# Altium schematic symbol library Wurth_Elektronik_Passive_rev16a.SCHLIB: 1143 symbols (part 11 of 27)
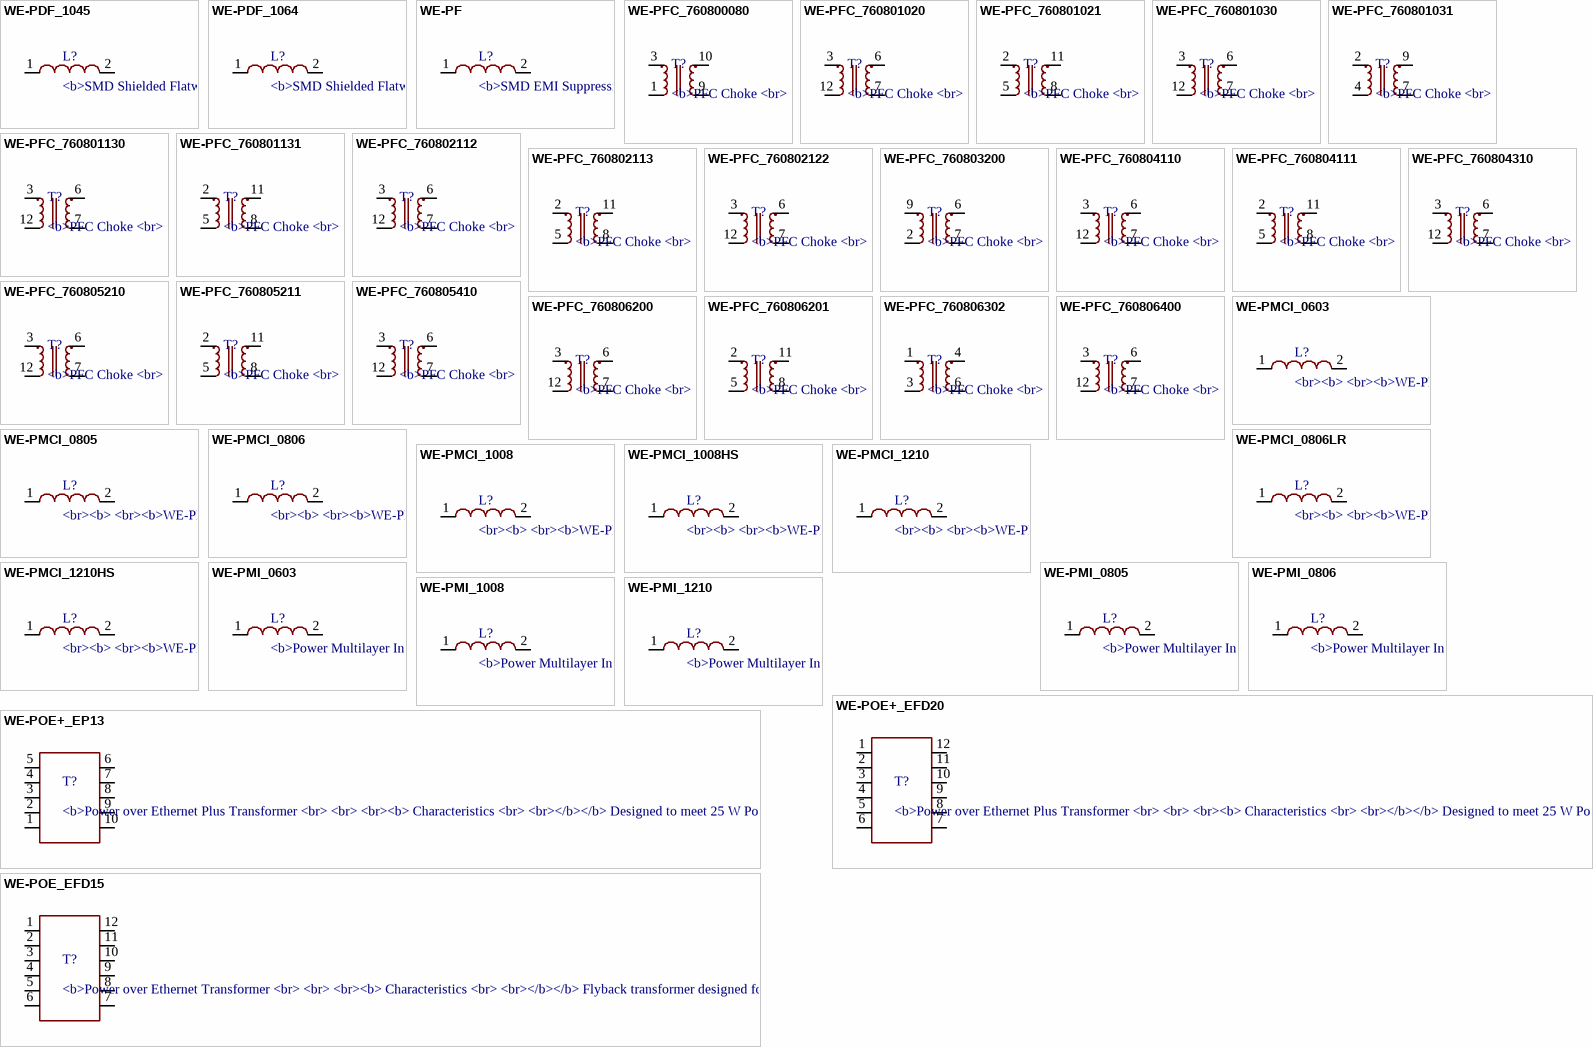
[diagram p68: symbols WE-PDF_1045 to WE-POE_EFD15]

## WE-PFC_760801031
designator T?, comment <b>PFC Choke / <br> / <br> / <br><b> Characteristics / <br> / <br></b></b> PFC choke for power up to 250 W / <br> / <br> Operating temperature: –40 °C to +125 °C / <br> / <br> PQ 38/11 construction height <10 mm above PCB / <br> / <br> Auxiliary winding / <br> / <br> RF strand for low losses due to skin and proximity effects / <br> / <br> / <br><b> Applications / <br> / <br></b> Active Power Factor correction / <br> / <br> For all ICs CPU PFC ON Semiconductor / <br> / <br> Lighting applications / <br> / <br> Switchmode power supplies / <br> / <br> / <br> / <br><a href="<br><a href="http://katalog.we-online.de/media/images/eisos/IndPFC_MID_pf2.jpg" title="Enlarge picture"> / <img src="http://katalog.we-online.de/media/images/eisos/IndPFC_MID_pf2.jpg" width="320"></a><p> / Details see: <a href="http://katalog.we-online.de/en/pbs/WE-PFC?">http://katalog.we-online.de/en/pbs/WE-PFC?</a><p> / Updated  by  Dan Xu 2014-07-08<br> / 2014 (C) Wurth Elektronik
footprint WE_EFD25_THT_HORIZONTAL_10PIN
pins: 2 1, 4, 7 3, 9 2

## WE-PFC_760801130
designator T?, comment <b>PFC Choke / <br> / <br> / <br><b> Characteristics / <br> / <br></b></b> PFC choke for power up to 250 W / <br> / <br> Operating temperature: –40 °C to +125 °C / <br> / <br> PQ 38/11 construction height <10 mm above PCB / <br> / <br> Auxiliary winding / <br> / <br> RF strand for low losses due to skin and proximity effects / <br> / <br> / <br><b> Applications / <br> / <br></b> Active Power Factor correction / <br> / <br> For all ICs CPU PFC ON Semiconductor / <br> / <br> Lighting applications / <br> / <br> Switchmode power supplies / <br> / <br> / <br> / <br><a href="<br><a href="http://katalog.we-online.de/media/images/eisos/IndPFC_MID_pf2.jpg" title="Enlarge picture"> / <img src="http://katalog.we-online.de/media/images/eisos/IndPFC_MID_pf2.jpg" width="320"></a><p> / Details see: <a href="http://katalog.we-online.de/en/pbs/WE-PFC?">http://katalog.we-online.de/en/pbs/WE-PFC?</a><p> / Updated  by  Dan Xu 2014-07-08<br> / 2014 (C) Wurth Elektronik
footprint WE_RM10_THT_12PIN
pins: 3 1, 6 2, 7 3, 12 4

## WE-PFC_760801131
designator T?, comment <b>PFC Choke / <br> / <br> / <br><b> Characteristics / <br> / <br></b></b> PFC choke for power up to 250 W / <br> / <br> Operating temperature: –40 °C to +125 °C / <br> / <br> PQ 38/11 construction height <10 mm above PCB / <br> / <br> Auxiliary winding / <br> / <br> RF strand for low losses due to skin and proximity effects / <br> / <br> / <br><b> Applications / <br> / <br></b> Active Power Factor correction / <br> / <br> For all ICs CPU PFC ON Semiconductor / <br> / <br> Lighting applications / <br> / <br> Switchmode power supplies / <br> / <br> / <br> / <br><a href="<br><a href="http://katalog.we-online.de/media/images/eisos/IndPFC_MID_pf2.jpg" title="Enlarge picture"> / <img src="http://katalog.we-online.de/media/images/eisos/IndPFC_MID_pf2.jpg" width="320"></a><p> / Details see: <a href="http://katalog.we-online.de/en/pbs/WE-PFC?">http://katalog.we-online.de/en/pbs/WE-PFC?</a><p> / Updated  by  Dan Xu 2014-07-08<br> / 2014 (C) Wurth Elektronik
footprint WE_EFD30_THT_12PIN
pins: 2 1, 5 4, 8 3, 11 2

## WE-PFC_760802112
designator T?, comment <b>PFC Choke / <br> / <br> / <br><b> Characteristics / <br> / <br></b></b> PFC choke for power up to 250 W / <br> / <br> Operating temperature: –40 °C to +125 °C / <br> / <br> PQ 38/11 construction height <10 mm above PCB / <br> / <br> Auxiliary winding / <br> / <br> RF strand for low losses due to skin and proximity effects / <br> / <br> / <br><b> Applications / <br> / <br></b> Active Power Factor correction / <br> / <br> For all ICs CPU PFC ON Semiconductor / <br> / <br> Lighting applications / <br> / <br> Switchmode power supplies / <br> / <br> / <br> / <br><a href="<br><a href="http://katalog.we-online.de/media/images/eisos/IndPFC_MID_pf2.jpg" title="Enlarge picture"> / <img src="http://katalog.we-online.de/media/images/eisos/IndPFC_MID_pf2.jpg" width="320"></a><p> / Details see: <a href="http://katalog.we-online.de/en/pbs/WE-PFC?">http://katalog.we-online.de/en/pbs/WE-PFC?</a><p> / Updated  by  Dan Xu 2014-07-08<br> / 2014 (C) Wurth Elektronik
footprint WE_RM10_THT_12PIN
pins: 3 1, 6 2, 7 3, 12 4

## WE-PFC_760802113
designator T?, comment <b>PFC Choke / <br> / <br> / <br><b> Characteristics / <br> / <br></b></b> PFC choke for power up to 250 W / <br> / <br> Operating temperature: –40 °C to +125 °C / <br> / <br> PQ 38/11 construction height <10 mm above PCB / <br> / <br> Auxiliary winding / <br> / <br> RF strand for low losses due to skin and proximity effects / <br> / <br> / <br><b> Applications / <br> / <br></b> Active Power Factor correction / <br> / <br> For all ICs CPU PFC ON Semiconductor / <br> / <br> Lighting applications / <br> / <br> Switchmode power supplies / <br> / <br> / <br> / <br><a href="<br><a href="http://katalog.we-online.de/media/images/eisos/IndPFC_MID_pf2.jpg" title="Enlarge picture"> / <img src="http://katalog.we-online.de/media/images/eisos/IndPFC_MID_pf2.jpg" width="320"></a><p> / Details see: <a href="http://katalog.we-online.de/en/pbs/WE-PFC?">http://katalog.we-online.de/en/pbs/WE-PFC?</a><p> / Updated  by  Dan Xu 2014-07-08<br> / 2014 (C) Wurth Elektronik
footprint WE_EFD30_THT_12PIN
pins: 2 1, 5 4, 8 3, 11 2

## WE-PFC_760802122
designator T?, comment <b>PFC Choke / <br> / <br> / <br><b> Characteristics / <br> / <br></b></b> PFC choke for power up to 250 W / <br> / <br> Operating temperature: –40 °C to +125 °C / <br> / <br> PQ 38/11 construction height <10 mm above PCB / <br> / <br> Auxiliary winding / <br> / <br> RF strand for low losses due to skin and proximity effects / <br> / <br> / <br><b> Applications / <br> / <br></b> Active Power Factor correction / <br> / <br> For all ICs CPU PFC ON Semiconductor / <br> / <br> Lighting applications / <br> / <br> Switchmode power supplies / <br> / <br> / <br> / <br><a href="<br><a href="http://katalog.we-online.de/media/images/eisos/IndPFC_MID_pf2.jpg" title="Enlarge picture"> / <img src="http://katalog.we-online.de/media/images/eisos/IndPFC_MID_pf2.jpg" width="320"></a><p> / Details see: <a href="http://katalog.we-online.de/en/pbs/WE-PFC?">http://katalog.we-online.de/en/pbs/WE-PFC?</a><p> / Updated  by  Dan Xu 2014-07-08<br> / 2014 (C) Wurth Elektronik
footprint WE_RM12_THT_12PIN
pins: 3 1, 6 2, 7 3, 12 4

## WE-PFC_760803200
designator T?, comment <b>PFC Choke / <br> / <br> / <br><b> Characteristics / <br> / <br></b></b> PFC choke for power up to 250 W / <br> / <br> Operating temperature: –40 °C to +125 °C / <br> / <br> PQ 38/11 construction height <10 mm above PCB / <br> / <br> Auxiliary winding / <br> / <br> RF strand for low losses due to skin and proximity effects / <br> / <br> / <br><b> Applications / <br> / <br></b> Active Power Factor correction / <br> / <br> For all ICs CPU PFC ON Semiconductor / <br> / <br> Lighting applications / <br> / <br> Switchmode power supplies / <br> / <br> / <br> / <br><a href="<br><a href="http://katalog.we-online.de/media/images/eisos/IndPFC_MID_pf2.jpg" title="Enlarge picture"> / <img src="http://katalog.we-online.de/media/images/eisos/IndPFC_MID_pf2.jpg" width="320"></a><p> / Details see: <a href="http://katalog.we-online.de/en/pbs/WE-PFC?">http://katalog.we-online.de/en/pbs/WE-PFC?</a><p> / Updated  by  Dan Xu 2014-07-08<br> / 2014 (C) Wurth Elektronik
footprint WE_EER28_THT_HORIZONTAL_9PIN
pins: 2 4, 6 2, 7 3, 9 1

## WE-PFC_760804110
designator T?, comment <b>PFC Choke / <br> / <br> / <br><b> Characteristics / <br> / <br></b></b> PFC choke for power up to 250 W / <br> / <br> Operating temperature: –40 °C to +125 °C / <br> / <br> PQ 38/11 construction height <10 mm above PCB / <br> / <br> Auxiliary winding / <br> / <br> RF strand for low losses due to skin and proximity effects / <br> / <br> / <br><b> Applications / <br> / <br></b> Active Power Factor correction / <br> / <br> For all ICs CPU PFC ON Semiconductor / <br> / <br> Lighting applications / <br> / <br> Switchmode power supplies / <br> / <br> / <br> / <br><a href="<br><a href="http://katalog.we-online.de/media/images/eisos/IndPFC_MID_pf2.jpg" title="Enlarge picture"> / <img src="http://katalog.we-online.de/media/images/eisos/IndPFC_MID_pf2.jpg" width="320"></a><p> / Details see: <a href="http://katalog.we-online.de/en/pbs/WE-PFC?">http://katalog.we-online.de/en/pbs/WE-PFC?</a><p> / Updated  by  Dan Xu 2014-07-08<br> / 2014 (C) Wurth Elektronik
footprint WE_RM10_THT_12PIN
pins: 3 1, 6 2, 7 3, 12 4

## WE-PFC_760804111
designator T?, comment <b>PFC Choke / <br> / <br> / <br><b> Characteristics / <br> / <br></b></b> PFC choke for power up to 250 W / <br> / <br> Operating temperature: –40 °C to +125 °C / <br> / <br> PQ 38/11 construction height <10 mm above PCB / <br> / <br> Auxiliary winding / <br> / <br> RF strand for low losses due to skin and proximity effects / <br> / <br> / <br><b> Applications / <br> / <br></b> Active Power Factor correction / <br> / <br> For all ICs CPU PFC ON Semiconductor / <br> / <br> Lighting applications / <br> / <br> Switchmode power supplies / <br> / <br> / <br> / <br><a href="<br><a href="http://katalog.we-online.de/media/images/eisos/IndPFC_MID_pf2.jpg" title="Enlarge picture"> / <img src="http://katalog.we-online.de/media/images/eisos/IndPFC_MID_pf2.jpg" width="320"></a><p> / Details see: <a href="http://katalog.we-online.de/en/pbs/WE-PFC?">http://katalog.we-online.de/en/pbs/WE-PFC?</a><p> / Updated  by  Dan Xu 2014-07-08<br> / 2014 (C) Wurth Elektronik
footprint WE_EFD30_THT_12PIN
pins: 2 1, 5 4, 8 3, 11 2

## WE-PFC_760804310
designator T?, comment <b>PFC Choke / <br> / <br> / <br><b> Characteristics / <br> / <br></b></b> PFC choke for power up to 250 W / <br> / <br> Operating temperature: –40 °C to +125 °C / <br> / <br> PQ 38/11 construction height <10 mm above PCB / <br> / <br> Auxiliary winding / <br> / <br> RF strand for low losses due to skin and proximity effects / <br> / <br> / <br><b> Applications / <br> / <br></b> Active Power Factor correction / <br> / <br> For all ICs CPU PFC ON Semiconductor / <br> / <br> Lighting applications / <br> / <br> Switchmode power supplies / <br> / <br> / <br> / <br><a href="<br><a href="http://katalog.we-online.de/media/images/eisos/IndPFC_MID_pf2.jpg" title="Enlarge picture"> / <img src="http://katalog.we-online.de/media/images/eisos/IndPFC_MID_pf2.jpg" width="320"></a><p> / Details see: <a href="http://katalog.we-online.de/en/pbs/WE-PFC?">http://katalog.we-online.de/en/pbs/WE-PFC?</a><p> / Updated  by  Dan Xu 2014-07-08<br> / 2014 (C) Wurth Elektronik
footprint WE_RM12_THT_12PIN
pins: 3 1, 6 2, 7 3, 12 4

## WE-PFC_760805210
designator T?, comment <b>PFC Choke / <br> / <br> / <br><b> Characteristics / <br> / <br></b></b> PFC choke for power up to 250 W / <br> / <br> Operating temperature: –40 °C to +125 °C / <br> / <br> PQ 38/11 construction height <10 mm above PCB / <br> / <br> Auxiliary winding / <br> / <br> RF strand for low losses due to skin and proximity effects / <br> / <br> / <br><b> Applications / <br> / <br></b> Active Power Factor correction / <br> / <br> For all ICs CPU PFC ON Semiconductor / <br> / <br> Lighting applications / <br> / <br> Switchmode power supplies / <br> / <br> / <br> / <br><a href="<br><a href="http://katalog.we-online.de/media/images/eisos/IndPFC_MID_pf2.jpg" title="Enlarge picture"> / <img src="http://katalog.we-online.de/media/images/eisos/IndPFC_MID_pf2.jpg" width="320"></a><p> / Details see: <a href="http://katalog.we-online.de/en/pbs/WE-PFC?">http://katalog.we-online.de/en/pbs/WE-PFC?</a><p> / Updated  by  Dan Xu 2014-07-08<br> / 2014 (C) Wurth Elektronik
footprint WE_RM12_THT_12PIN
pins: 3 1, 6 2, 7 3, 12 4

## WE-PFC_760805211
designator T?, comment <b>PFC Choke / <br> / <br> / <br><b> Characteristics / <br> / <br></b></b> PFC choke for power up to 250 W / <br> / <br> Operating temperature: –40 °C to +125 °C / <br> / <br> PQ 38/11 construction height <10 mm above PCB / <br> / <br> Auxiliary winding / <br> / <br> RF strand for low losses due to skin and proximity effects / <br> / <br> / <br><b> Applications / <br> / <br></b> Active Power Factor correction / <br> / <br> For all ICs CPU PFC ON Semiconductor / <br> / <br> Lighting applications / <br> / <br> Switchmode power supplies / <br> / <br> / <br> / <br><a href="<br><a href="http://katalog.we-online.de/media/images/eisos/IndPFC_MID_pf2.jpg" title="Enlarge picture"> / <img src="http://katalog.we-online.de/media/images/eisos/IndPFC_MID_pf2.jpg" width="320"></a><p> / Details see: <a href="http://katalog.we-online.de/en/pbs/WE-PFC?">http://katalog.we-online.de/en/pbs/WE-PFC?</a><p> / Updated  by  Dan Xu 2014-07-08<br> / 2014 (C) Wurth Elektronik
footprint WE_EFD30_THT_12PIN
pins: 2 1, 5 4, 8 3, 11 2

## WE-PFC_760805410
designator T?, comment <b>PFC Choke / <br> / <br> / <br><b> Characteristics / <br> / <br></b></b> PFC choke for power up to 250 W / <br> / <br> Operating temperature: –40 °C to +125 °C / <br> / <br> PQ 38/11 construction height <10 mm above PCB / <br> / <br> Auxiliary winding / <br> / <br> RF strand for low losses due to skin and proximity effects / <br> / <br> / <br><b> Applications / <br> / <br></b> Active Power Factor correction / <br> / <br> For all ICs CPU PFC ON Semiconductor / <br> / <br> Lighting applications / <br> / <br> Switchmode power supplies / <br> / <br> / <br> / <br><a href="<br><a href="http://katalog.we-online.de/media/images/eisos/IndPFC_MID_pf2.jpg" title="Enlarge picture"> / <img src="http://katalog.we-online.de/media/images/eisos/IndPFC_MID_pf2.jpg" width="320"></a><p> / Details see: <a href="http://katalog.we-online.de/en/pbs/WE-PFC?">http://katalog.we-online.de/en/pbs/WE-PFC?</a><p> / Updated  by  Dan Xu 2014-07-08<br> / 2014 (C) Wurth Elektronik
footprint WE_RM14_THT_12PIN
pins: 3 1, 6 2, 7 3, 12 4

## WE-PFC_760806200
designator T?, comment <b>PFC Choke / <br> / <br> / <br><b> Characteristics / <br> / <br></b></b> PFC choke for power up to 250 W / <br> / <br> Operating temperature: –40 °C to +125 °C / <br> / <br> PQ 38/11 construction height <10 mm above PCB / <br> / <br> Auxiliary winding / <br> / <br> RF strand for low losses due to skin and proximity effects / <br> / <br> / <br><b> Applications / <br> / <br></b> Active Power Factor correction / <br> / <br> For all ICs CPU PFC ON Semiconductor / <br> / <br> Lighting applications / <br> / <br> Switchmode power supplies / <br> / <br> / <br> / <br><a href="<br><a href="http://katalog.we-online.de/media/images/eisos/IndPFC_MID_pf2.jpg" title="Enlarge picture"> / <img src="http://katalog.we-online.de/media/images/eisos/IndPFC_MID_pf2.jpg" width="320"></a><p> / Details see: <a href="http://katalog.we-online.de/en/pbs/WE-PFC?">http://katalog.we-online.de/en/pbs/WE-PFC?</a><p> / Updated  by  Dan Xu 2014-07-08<br> / 2014 (C) Wurth Elektronik
footprint WE_RM12_THT_12PIN
pins: 3 1, 6 2, 7 3, 12 4

## WE-PFC_760806201
designator T?, comment <b>PFC Choke / <br> / <br> / <br><b> Characteristics / <br> / <br></b></b> PFC choke for power up to 250 W / <br> / <br> Operating temperature: –40 °C to +125 °C / <br> / <br> PQ 38/11 construction height <10 mm above PCB / <br> / <br> Auxiliary winding / <br> / <br> RF strand for low losses due to skin and proximity effects / <br> / <br> / <br><b> Applications / <br> / <br></b> Active Power Factor correction / <br> / <br> For all ICs CPU PFC ON Semiconductor / <br> / <br> Lighting applications / <br> / <br> Switchmode power supplies / <br> / <br> / <br> / <br><a href="<br><a href="http://katalog.we-online.de/media/images/eisos/IndPFC_MID_pf2.jpg" title="Enlarge picture"> / <img src="http://katalog.we-online.de/media/images/eisos/IndPFC_MID_pf2.jpg" width="320"></a><p> / Details see: <a href="http://katalog.we-online.de/en/pbs/WE-PFC?">http://katalog.we-online.de/en/pbs/WE-PFC?</a><p> / Updated  by  Dan Xu 2014-07-08<br> / 2014 (C) Wurth Elektronik
footprint WE_EFD30_THT_12PIN
pins: 2 1, 5 4, 8 3, 11 2

## WE-PFC_760806302
designator T?, comment <b>PFC Choke / <br> / <br> / <br><b> Characteristics / <br> / <br></b></b> PFC choke for power up to 250 W / <br> / <br> Operating temperature: –40 °C to +125 °C / <br> / <br> PQ 38/11 construction height <10 mm above PCB / <br> / <br> Auxiliary winding / <br> / <br> RF strand for low losses due to skin and proximity effects / <br> / <br> / <br><b> Applications / <br> / <br></b> Active Power Factor correction / <br> / <br> For all ICs CPU PFC ON Semiconductor / <br> / <br> Lighting applications / <br> / <br> Switchmode power supplies / <br> / <br> / <br> / <br><a href="<br><a href="http://katalog.we-online.de/media/images/eisos/IndPFC_MID_pf2.jpg" title="Enlarge picture"> / <img src="http://katalog.we-online.de/media/images/eisos/IndPFC_MID_pf2.jpg" width="320"></a><p> / Details see: <a href="http://katalog.we-online.de/en/pbs/WE-PFC?">http://katalog.we-online.de/en/pbs/WE-PFC?</a><p> / Updated  by  Dan Xu 2014-07-08<br> / 2014 (C) Wurth Elektronik
footprint WE_PQ38/11_6PIN
pins: 1, 3 4, 4 2, 6 3

## WE-PFC_760806400
designator T?, comment <b>PFC Choke / <br> / <br> / <br><b> Characteristics / <br> / <br></b></b> PFC choke for power up to 250 W / <br> / <br> Operating temperature: –40 °C to +125 °C / <br> / <br> PQ 38/11 construction height <10 mm above PCB / <br> / <br> Auxiliary winding / <br> / <br> RF strand for low losses due to skin and proximity effects / <br> / <br> / <br><b> Applications / <br> / <br></b> Active Power Factor correction / <br> / <br> For all ICs CPU PFC ON Semiconductor / <br> / <br> Lighting applications / <br> / <br> Switchmode power supplies / <br> / <br> / <br> / <br><a href="<br><a href="http://katalog.we-online.de/media/images/eisos/IndPFC_MID_pf2.jpg" title="Enlarge picture"> / <img src="http://katalog.we-online.de/media/images/eisos/IndPFC_MID_pf2.jpg" width="320"></a><p> / Details see: <a href="http://katalog.we-online.de/en/pbs/WE-PFC?">http://katalog.we-online.de/en/pbs/WE-PFC?</a><p> / Updated  by  Dan Xu 2014-07-08<br> / 2014 (C) Wurth Elektronik
footprint WE_RM14_THT_12PIN
pins: 3 1, 6 2, 7 3, 12 4

## WE-PMCI_0603
designator L?, comment <br><b> <br><b>WE-PMCI Power Molded Chip / Inductor<br><br></b></b> / <P> <font color="#0000FF"><B>Characteristics</B></font></td><BR> / <br>Compact inductor chip type / <br>High effciency / <br>Suitable for applications with high currents up to 3.6 A. Very high DC-Bias current / <br>Very small electrical resistance, smallest RDC-Values starting at 19 mΩ / <br>Magnetically shielded construction: No crosstalk / <br>Operating temperature: –40 °C to +125 °C / <br>Available in five sizes and three different types (Low Profile, Standard and High Saturation Current) / <br>Recommended soldering profile: Reflow / <P> <font color="#0000FF"><B>Applications</B></font></td><BR><BR> / <br>DC/DC converters especially at high switching frequencies > 1 MHz / <br>High current power supply, Battery powered devices / <br>Powerable electronic devices with very low profile / <br>Portable devices like Smart Phones, Tablets, Notebooks and Digital Cameras / <br> / <br> / <br> / <br> / <br><a href="http://katalog.we-online.de/media/images/v2/Family_WE-PMCI.jpg" title="Enlarge picture"> / <img src="http://katalog.we-online.de/media/images/v2/Family_WE-PMCI.jpg" width="320"></a><p> / Details see: <a href="http://katalog.we-online.de/en/pbs/WE-PMCI">http://katalog.we-online.de/en/pbs/WE-PMCI</a><p> / <br></b>2015 (C) Wurth Elektronik
footprint 0603_74479262XXX
pins: 1, 2

## WE-PMCI_0805
designator L?, comment <br><b> <br><b>WE-PMCI Power Molded Chip / Inductor<br><br></b></b> / <P> <font color="#0000FF"><B>Characteristics</B></font></td><BR> / <br>Compact inductor chip type / <br>High effciency / <br>Suitable for applications with high currents up to 3.6 A. Very high DC-Bias current / <br>Very small electrical resistance, smallest RDC-Values starting at 19 mΩ / <br>Magnetically shielded construction: No crosstalk / <br>Operating temperature: –40 °C to +125 °C / <br>Available in five sizes and three different types (Low Profile, Standard and High Saturation Current) / <br>Recommended soldering profile: Reflow / <P> <font color="#0000FF"><B>Applications</B></font></td><BR><BR> / <br>DC/DC converters especially at high switching frequencies > 1 MHz / <br>High current power supply, Battery powered devices / <br>Powerable electronic devices with very low profile / <br>Portable devices like Smart Phones, Tablets, Notebooks and Digital Cameras / <br> / <br> / <br> / <br> / <br><a href="http://katalog.we-online.de/media/images/v2/Family_WE-PMCI.jpg" title="Enlarge picture"> / <img src="http://katalog.we-online.de/media/images/v2/Family_WE-PMCI.jpg" width="320"></a><p> / Details see: <a href="http://katalog.we-online.de/en/pbs/WE-PMCI">http://katalog.we-online.de/en/pbs/WE-PMCI</a><p> / <br></b>2015 (C) Wurth Elektronik
footprint 0805_74479275XXX
pins: 1, 2

## WE-PMCI_0806
designator L?, comment <br><b> <br><b>WE-PMCI Power Molded Chip / Inductor<br><br></b></b> / <P> <font color="#0000FF"><B>Characteristics</B></font></td><BR> / <br>Compact inductor chip type / <br>High effciency / <br>Suitable for applications with high currents up to 3.6 A. Very high DC-Bias current / <br>Very small electrical resistance, smallest RDC-Values starting at 19 mΩ / <br>Magnetically shielded construction: No crosstalk / <br>Operating temperature: –40 °C to +125 °C / <br>Available in five sizes and three different types (Low Profile, Standard and High Saturation Current) / <br>Recommended soldering profile: Reflow / <P> <font color="#0000FF"><B>Applications</B></font></td><BR><BR> / <br>DC/DC converters especially at high switching frequencies > 1 MHz / <br>High current power supply, Battery powered devices / <br>Powerable electronic devices with very low profile / <br>Portable devices like Smart Phones, Tablets, Notebooks and Digital Cameras / <br> / <br> / <br> / <br> / <br><a href="http://katalog.we-online.de/media/images/v2/Family_WE-PMCI.jpg" title="Enlarge picture"> / <img src="http://katalog.we-online.de/media/images/v2/Family_WE-PMCI.jpg" width="320"></a><p> / Details see: <a href="http://katalog.we-online.de/en/pbs/WE-PMCI">http://katalog.we-online.de/en/pbs/WE-PMCI</a><p> / <br></b>2015 (C) Wurth Elektronik
footprint 0806_74479276XXX
pins: 1, 2

## WE-PMCI_0806LR
designator L?, comment <br><b> <br><b>WE-PMCI Power Molded Chip / Inductor<br><br></b></b> / <P> <font color="#0000FF"><B>Characteristics</B></font></td><BR> / <br>Compact inductor chip type / <br>High effciency / <br>Suitable for applications with high currents up to 3.6 A. Very high DC-Bias current / <br>Very small electrical resistance, smallest RDC-Values starting at 19 mΩ / <br>Magnetically shielded construction: No crosstalk / <br>Operating temperature: –40 °C to +125 °C / <br>Available in five sizes and three different types (Low Profile, Standard and High Saturation Current) / <br>Recommended soldering profile: Reflow / <P> <font color="#0000FF"><B>Applications</B></font></td><BR><BR> / <br>DC/DC converters especially at high switching frequencies > 1 MHz / <br>High current power supply, Battery powered devices / <br>Powerable electronic devices with very low profile / <br>Portable devices like Smart Phones, Tablets, Notebooks and Digital Cameras / <br> / <br> / <br> / <br> / <br><a href="http://katalog.we-online.de/media/images/v2/Family_WE-PMCI.jpg" title="Enlarge picture"> / <img src="http://katalog.we-online.de/media/images/v2/Family_WE-PMCI.jpg" width="320"></a><p> / Details see: <a href="http://katalog.we-online.de/en/pbs/WE-PMCI">http://katalog.we-online.de/en/pbs/WE-PMCI</a><p> / <br></b>2015 (C) Wurth Elektronik
footprint 0806_74479276XXXC
pins: 1, 2

## WE-PMCI_1008
designator L?, comment <br><b> <br><b>WE-PMCI Power Molded Chip / Inductor<br><br></b></b> / <P> <font color="#0000FF"><B>Characteristics</B></font></td><BR> / <br>Compact inductor chip type / <br>High effciency / <br>Suitable for applications with high currents up to 3.6 A. Very high DC-Bias current / <br>Very small electrical resistance, smallest RDC-Values starting at 19 mΩ / <br>Magnetically shielded construction: No crosstalk / <br>Operating temperature: –40 °C to +125 °C / <br>Available in five sizes and three different types (Low Profile, Standard and High Saturation Current) / <br>Recommended soldering profile: Reflow / <P> <font color="#0000FF"><B>Applications</B></font></td><BR><BR> / <br>DC/DC converters especially at high switching frequencies > 1 MHz / <br>High current power supply, Battery powered devices / <br>Powerable electronic devices with very low profile / <br>Portable devices like Smart Phones, Tablets, Notebooks and Digital Cameras / <br> / <br> / <br> / <br> / <br><a href="http://katalog.we-online.de/media/images/v2/Family_WE-PMCI.jpg" title="Enlarge picture"> / <img src="http://katalog.we-online.de/media/images/v2/Family_WE-PMCI.jpg" width="320"></a><p> / Details see: <a href="http://katalog.we-online.de/en/pbs/WE-PMCI">http://katalog.we-online.de/en/pbs/WE-PMCI</a><p> / <br></b>2015 (C) Wurth Elektronik
footprint 1008_74479287XXX
pins: 1, 2

## WE-PMCI_1008HS
designator L?, comment <br><b> <br><b>WE-PMCI Power Molded Chip / Inductor<br><br></b></b> / <P> <font color="#0000FF"><B>Characteristics</B></font></td><BR> / <br>Compact inductor chip type / <br>High effciency / <br>Suitable for applications with high currents up to 3.6 A. Very high DC-Bias current / <br>Very small electrical resistance, smallest RDC-Values starting at 19 mΩ / <br>Magnetically shielded construction: No crosstalk / <br>Operating temperature: –40 °C to +125 °C / <br>Available in five sizes and three different types (Low Profile, Standard and High Saturation Current) / <br>Recommended soldering profile: Reflow / <P> <font color="#0000FF"><B>Applications</B></font></td><BR><BR> / <br>DC/DC converters especially at high switching frequencies > 1 MHz / <br>High current power supply, Battery powered devices / <br>Powerable electronic devices with very low profile / <br>Portable devices like Smart Phones, Tablets, Notebooks and Digital Cameras / <br> / <br> / <br> / <br> / <br><a href="http://katalog.we-online.de/media/images/v2/Family_WE-PMCI.jpg" title="Enlarge picture"> / <img src="http://katalog.we-online.de/media/images/v2/Family_WE-PMCI.jpg" width="320"></a><p> / Details see: <a href="http://katalog.we-online.de/en/pbs/WE-PMCI">http://katalog.we-online.de/en/pbs/WE-PMCI</a><p> / <br></b>2015 (C) Wurth Elektronik
footprint 1008_74479288XXX
pins: 1, 2

## WE-PMCI_1210
designator L?, comment <br><b> <br><b>WE-PMCI Power Molded Chip / Inductor<br><br></b></b> / <P> <font color="#0000FF"><B>Characteristics</B></font></td><BR> / <br>Compact inductor chip type / <br>High effciency / <br>Suitable for applications with high currents up to 3.6 A. Very high DC-Bias current / <br>Very small electrical resistance, smallest RDC-Values starting at 19 mΩ / <br>Magnetically shielded construction: No crosstalk / <br>Operating temperature: –40 °C to +125 °C / <br>Available in five sizes and three different types (Low Profile, Standard and High Saturation Current) / <br>Recommended soldering profile: Reflow / <P> <font color="#0000FF"><B>Applications</B></font></td><BR><BR> / <br>DC/DC converters especially at high switching frequencies > 1 MHz / <br>High current power supply, Battery powered devices / <br>Powerable electronic devices with very low profile / <br>Portable devices like Smart Phones, Tablets, Notebooks and Digital Cameras / <br> / <br> / <br> / <br> / <br><a href="http://katalog.we-online.de/media/images/v2/Family_WE-PMCI.jpg" title="Enlarge picture"> / <img src="http://katalog.we-online.de/media/images/v2/Family_WE-PMCI.jpg" width="320"></a><p> / Details see: <a href="http://katalog.we-online.de/en/pbs/WE-PMCI">http://katalog.we-online.de/en/pbs/WE-PMCI</a><p> / <br></b>2015 (C) Wurth Elektronik
footprint 1210_74479298XXX
pins: 1, 2

## WE-PMCI_1210HS
designator L?, comment <br><b> <br><b>WE-PMCI Power Molded Chip / Inductor<br><br></b></b> / <P> <font color="#0000FF"><B>Characteristics</B></font></td><BR> / <br>Compact inductor chip type / <br>High effciency / <br>Suitable for applications with high currents up to 3.6 A. Very high DC-Bias current / <br>Very small electrical resistance, smallest RDC-Values starting at 19 mΩ / <br>Magnetically shielded construction: No crosstalk / <br>Operating temperature: –40 °C to +125 °C / <br>Available in five sizes and three different types (Low Profile, Standard and High Saturation Current) / <br>Recommended soldering profile: Reflow / <P> <font color="#0000FF"><B>Applications</B></font></td><BR><BR> / <br>DC/DC converters especially at high switching frequencies > 1 MHz / <br>High current power supply, Battery powered devices / <br>Powerable electronic devices with very low profile / <br>Portable devices like Smart Phones, Tablets, Notebooks and Digital Cameras / <br> / <br> / <br> / <br> / <br><a href="http://katalog.we-online.de/media/images/v2/Family_WE-PMCI.jpg" title="Enlarge picture"> / <img src="http://katalog.we-online.de/media/images/v2/Family_WE-PMCI.jpg" width="320"></a><p> / Details see: <a href="http://katalog.we-online.de/en/pbs/WE-PMCI">http://katalog.we-online.de/en/pbs/WE-PMCI</a><p> / <br></b>2015 (C) Wurth Elektronik
footprint 1210_74479299XXX
pins: 1, 2

## WE-PMI_0603
designator L?, comment <b>Power Multilayer Inductor / <br> / <br> / <br><b> Characteristics / <br> / <br></b></b> Compact multilayer type / <br> / <br> Suitable for applications with high currents up to 2.7 A / <br> / <br> Smallest RDC-Values starting at 40 mΩ / <br> / <br> Magnetically shielded construction: No crosstalk / <br> / <br> Operating temperature: –40 °C to +125 °C / <br> / <br> Available in four sizes and three different types (Low Profile, Low RDC & High Saturation Current) / <br> / <br> Recommended soldering profile: Reflow / <br> / <br> / <br><b> Applications / <br> / <br></b> DC/DC converters especially at high switching frequencies > 1 MHz / <br> / <br> Electronic devices with very low profile / <br> / <br> Portable devices like Smart Phones, Tablets, Notebooks and Digital Cameras / <br> / <br> / <br> / <br><a href="<br><a href="http://katalog.we-online.de/media/images/eisos/IndPMI_pf2.jpgg" title="Enlarge picture"> / <img src="http://katalog.we-online.de/media/images/eisos/IndPMI_pf2.jpg" width="320"></a><p> / Details see: <a href="http://katalog.we-online.de/en/pbs/WE-PMI?">http://katalog.we-online.de/en/pbs/WE-PMI?</a><p> / Updated  by  Dan Xu 2014-07-08<br> / 2014 (C) Wurth Elektronik
footprint WE-PMI_0603
pins: 1, 2
